# Altium footprint library 金属膜电容.PcbLib: 38 footprints (part 1 of 3)
Each footprint in its own frame and in the unit in brackets; x right, y up, seen from the top. Pads: shape width x height; smd on the part's side, far side on the other; paste and mask are expansions set on the pad; w line width, h text height; cw(c..) or ccw(c..) is an arc to the next point about the centre after c.
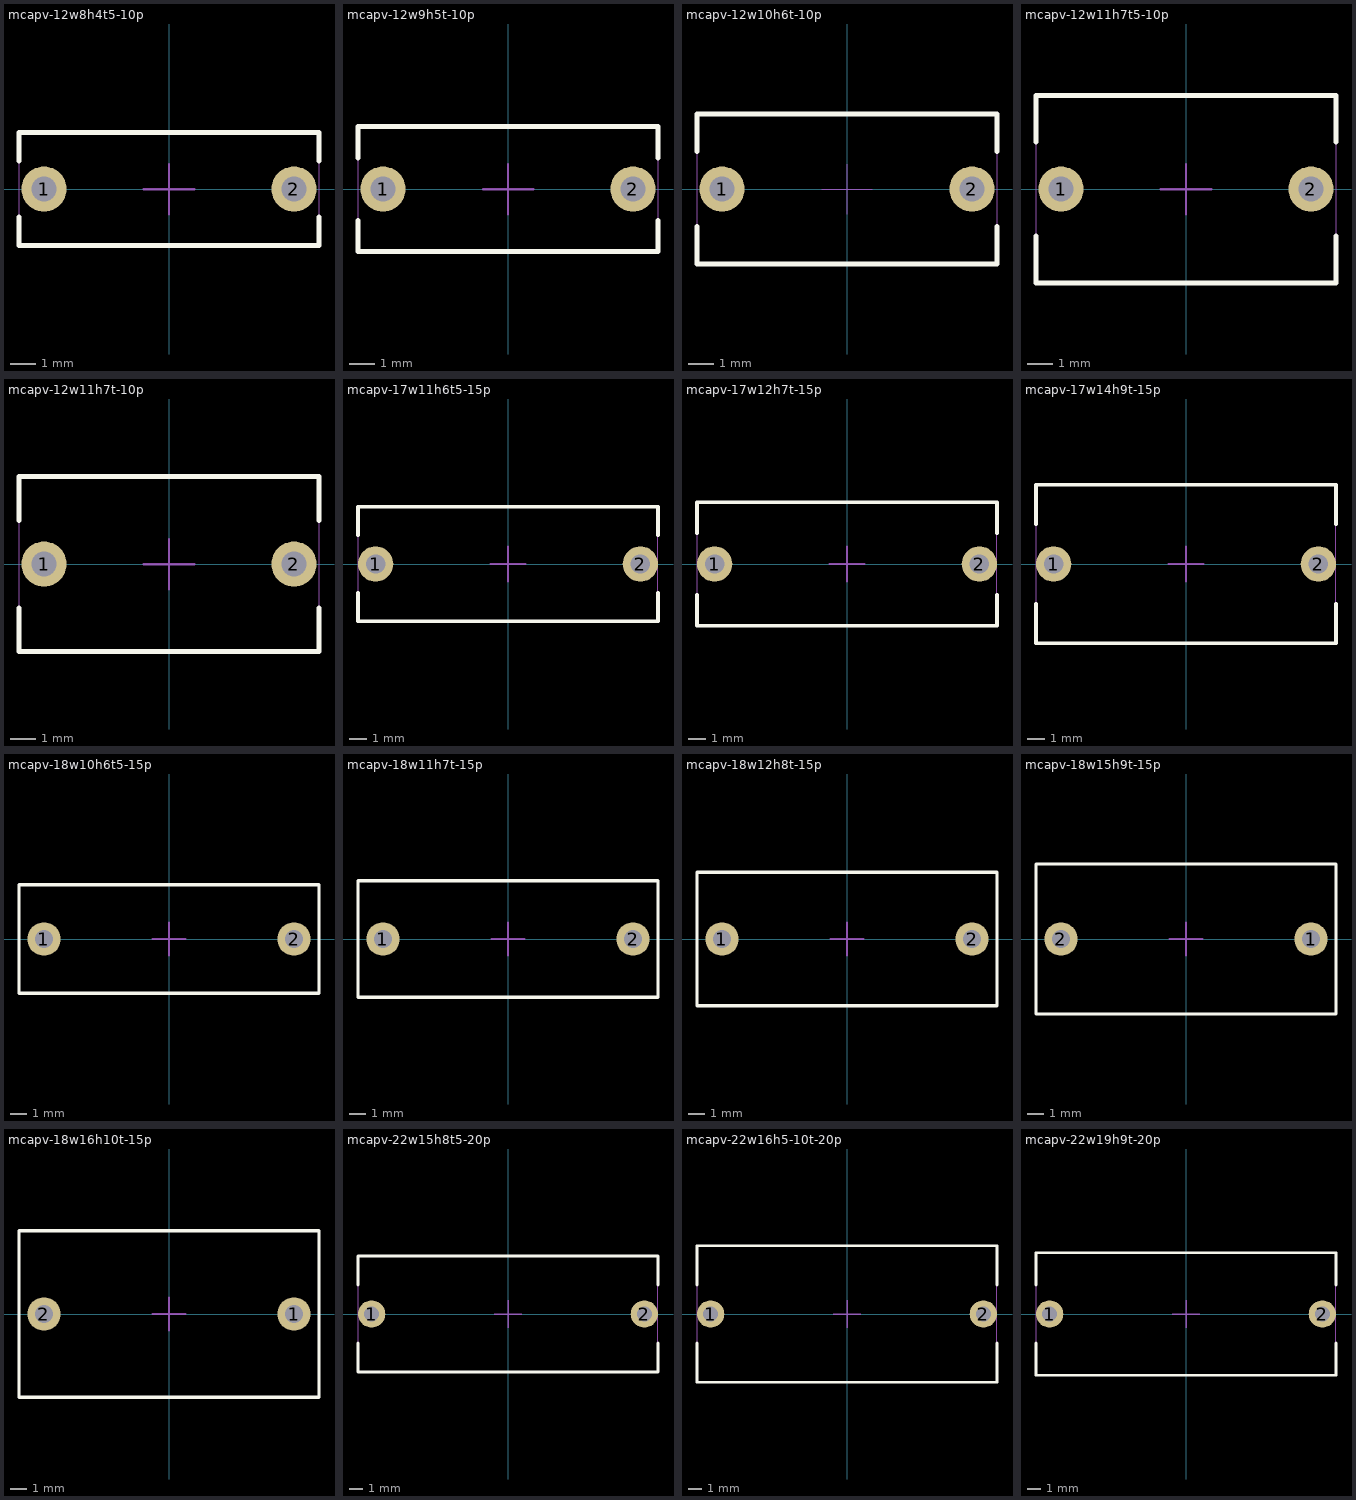
[diagram p0: the footprints below, top view; thin cyan lines are the x and y axes]

## mcapv-12w8h4t5-10p [mm] "金属膜电容"
height 9
pads (2):
  round 1.8 hole 1: 1(-5,0) 2(5,0)
Top Overlay:
  lines w0.2: -6,-1.125 -6,-2.25 6,-2.25 6,-1.125 ; -6,1.126 -6,2.251 6,2.251 6,1.126
Mechanical 13:
  lines w0.05: -6,-2.25 6,-2.25 6,2.251 -6,2.251 -6,-2.25
Mechanical 15:
  lines w0.1: -1,0 1,0 ; 0,-1 0,1
3D body: height 9, standoff -4, extent -6,-2.25 6,2.251

## mcapv-12w9h5t-10p [mm] "金属膜电容"
height 10
pads (2):
  round 1.8 hole 1: 1(-5,0) 2(5,0)
Top Overlay:
  lines w0.2: -6,-1.25 -6,-2.5 6,-2.5 6,-1.25 ; -6,1.25 -6,2.5 6,2.5 6,1.25
Mechanical 13:
  lines w0.05: -6,-2.5 6,-2.5 6,2.501 -6,2.501 -6,-2.5
Mechanical 15:
  lines w0.1: -0.991,0 1,0 ; 0,-1 0,1
3D body: height 10.5, standoff -3.5, extent -6,-2.5 6,2.501

## mcapv-12w10h6t-10p [mm] "金属化薄膜电容"
height 11
pads (2):
  round 1.8 hole 1: 1(-5,0) 2(5,0)
Top Overlay:
  lines w0.2: -6,-1.5 -6,-3 6,-3 6,-1.5 ; -6,1.5 -6,3 6,3 6,1.5
Mechanical 13:
  lines w0.05: -6,-3 6,-3 6,3.001 -6,3.001 -6,-3
Mechanical 15:
  lines w0.05: -1,0 1,0 ; 0,-1 0,1
3D body: height 11, standoff -4, extent -6,-3 6,3.001

## mcapv-12w11h7t5-10p [mm] "金属化薄膜电容"
height 12
pads (2):
  round 1.8 hole 1: 1(-5,0) 2(5,0)
Top Overlay:
  lines w0.2: -6,-1.875 -6,-3.75 6,-3.75 6,-1.875 ; -6,1.875 -6,3.75 6,3.75 6,1.875
Mechanical 13:
  lines w0.05: -6,-3.75 6,-3.75 6,3.751 -6,3.751 -6,-3.75
Mechanical 15:
  lines w0.1: -1,0 1,0 ; 0,-1 0,1
3D body: height 12, standoff -4, extent -6,-3.75 6,3.751

## mcapv-12w11h7t-10p [mm] "金属化薄膜电容"
height 12
pads (2):
  round 1.8 hole 1: 1(-5,0) 2(5,0)
Top Overlay:
  lines w0.2: -6,-1.75 -6,-3.5 6,-3.5 6,-1.75 ; -6,1.75 -6,3.5 6,3.5 6,1.75
Mechanical 13:
  lines w0.05: -6,-3.5 6,-3.5 6,3.501 -6,3.501 -6,-3.5
Mechanical 15:
  lines w0.1: -1,0 1,0 ; 0,-1 0,1
3D body: height 12, standoff -4, extent -6,-3.5 6,3.501

## mcapv-17w11h6t5-15p [mm] "金属化薄膜电容"
height 7
pads (2):
  round 2 hole 1.1: 1(-7.5,0) 2(7.5,0)
Top Overlay:
  lines w0.2: -8.5,-1.625 -8.5,-3.25 8.5,-3.25 8.5,-1.625 ; -8.5,1.625 -8.5,3.25 8.5,3.25 8.5,1.625
Mechanical 13:
  lines w0.05: -8.5,-3.25 -8.5,3.251 8.5,3.251 8.5,-3.25 -8.5,-3.25
Mechanical 15:
  lines w0.1: -0.991,0 1,0 ; 0,-1 0,1
3D body: height 12.5, standoff -3.5, extent -8.5,-3.25 8.5,3.251

## mcapv-17w12h7t-15p [mm] "金属化薄膜电容"
height 7
pads (2):
  round 2 hole 1.1: 1(-7.5,0) 2(7.5,0)
Top Overlay:
  lines w0.2: -8.5,-1.75 -8.5,-3.5 8.5,-3.5 8.5,-1.75 ; -8.5,1.75 -8.5,3.5 8.5,3.5 8.5,1.75
Mechanical 13:
  lines w0.05: -8.5,-3.5 -8.5,3.501 8.5,3.501 8.5,-3.5 -8.5,-3.5
Mechanical 15:
  lines w0.1: -1,0 1,0 ; 0,-1 0,1
3D body: height 12, standoff -5, extent -8.5,-3.5 8.5,3.501

## mcapv-17w14h9t-15p [mm] "金属化薄膜电容"
height 8
pads (2):
  round 2 hole 1.1: 1(-7.5,0) 2(7.5,0)
Top Overlay:
  lines w0.2: -8.5,-2.25 -8.5,-4.5 8.5,-4.5 8.5,-2.25 ; -8.5,2.25 -8.5,4.5 8.5,4.5 8.5,2.25
Mechanical 13:
  lines w0.05: -8.5,-4.5 8.5,-4.5 8.5,4.501 -8.5,4.501 -8.5,-4.5
Mechanical 15:
  lines w0.1: -1,0 1,0 ; 0,-1 0,1
3D body: height 15, standoff -4, extent -8.5,-4.5 8.5,4.501

## mcapv-18w10h6t5-15p [mm] "金属化薄膜电容"
height 6
pads (2):
  round 2 hole 1.1: 1(-7.5,0) 2(7.5,0)
Top Overlay:
  lines w0.2: -9,-3.25 9,-3.25 9,3.25 -9,3.25 -9,-3.25
Mechanical 13:
  lines w0.05: -9,-3.25 -9,3.251 9,3.251 9,-3.25 -9,-3.25
Mechanical 15:
  lines w0.1: -1,0 1,0 ; 0,-1 0,1
3D body: height 11, standoff -4, extent -9,-3.25 9,3.251

## mcapv-18w11h7t-15p [mm] "金属化薄膜电容"
height 7
pads (2):
  round 2 hole 1.1: 1(-7.5,0) 2(7.5,0)
Top Overlay:
  lines w0.2: -9,-3.5 -9,3.5 9,3.5 9,-3.5 -9,-3.5
Mechanical 13:
  lines w0.05: -9,-3.5 9,-3.5 9,3.501 -9,3.501 -9,-3.5
Mechanical 15:
  lines w0.1: -1,0 1,0 ; 0,-1 0,1
3D body: height 12, standoff -4, extent -9,-3.5 9,3.501

## mcapv-18w12h8t-15p [mm] "金属化薄膜电容"
height 7
pads (2):
  round 2 hole 1.1: 1(-7.5,0) 2(7.5,0)
Top Overlay:
  lines w0.2: -9,-4 9,-4 9,4 -9,4 -9,-4
Mechanical 13:
  lines w0.05: -9,-4 9,-4 9,4.001 -9,4.001 -9,-4
Mechanical 15:
  lines w0.1: -1,0 1,0 ; 0,-1 0,1
3D body: height 13, standoff -4, extent -9,-4 9,4.001

## mcapv-18w15h9t-15p [mm] "金属化薄膜电容"
height 8
pads (2):
  round 2 hole 1.1: 1(7.5,0) 2(-7.5,0)
Top Overlay:
  lines w0.2: -9,-4.5 9,-4.5 9,4.5 -9,4.5 -9,-4.5
Mechanical 13:
  lines w0.05: -9,-4.5 9,-4.5 9,4.506 -9,4.506 -9,-4.5
Mechanical 15:
  lines w0.1: -1,0 1,0 ; 0,-1 0,1
3D body: height 16, standoff -4, extent -9,-4.5 9,4.506

## mcapv-18w16h10t-15p [mm] "金属化薄膜电容"
height 9
pads (2):
  round 2 hole 1.1: 1(7.5,0) 2(-7.5,0)
Top Overlay:
  lines w0.2: -1,-5 -9,-5 ; -9,-5 9,-5 9,5 -9,5 -9,-5
Mechanical 13:
  lines w0.05: -9,-5 -9,5 9,5 9,-5 -9,-5
Mechanical 15:
  lines w0.1: -1,0 1,0 ; 0,-1 0,1
3D body: height 17, standoff -4, extent -9,-5 9,5.001

## mcapv-22w15h8t5-20p [mm] "金属化薄膜电容"
height 9
pads (2):
  round 2 hole 1.1: 1(-10,0) 2(10,0)
Top Overlay:
  lines w0.2: -11,-2.125 -11,-4.25 11,-4.25 11,-2.125 ; -11,2.125 -11,4.25 11,4.25 11,2.125
Mechanical 13:
  lines w0.05: -11,-4.25 11,-4.25 11,4.251 -11,4.251 -11,-4.25
Mechanical 15:
  lines w0.1: -1,0 1,0 ; 0,-1 0,1
3D body: height 16, standoff -4, extent -11,-4.25 11,4.251

## mcapv-22w16h5-10t-20p [mm] "金属化薄膜电容"
height 9
pads (2):
  round 2 hole 1.1: 1(-10,0) 2(10,0)
Top Overlay:
  lines w0.2: -11,-2.125 -11,-5 11,-5 11,-2.125 ; -11,2.125 -11,5.001 11,5.001 11,2.125
Mechanical 13:
  lines w0.05: -11,-5 -11,5.001 11,5.001 11,-5 -11,-5
Mechanical 15:
  lines w0.1: -1,0 1,0 ; 0,-1 0,1
3D body: height 17.25, standoff -4.25, extent -11,-5 11,5.001

## mcapv-22w19h9t-20p [mm] "金属化薄膜电容"
height 10.5
pads (2):
  round 2 hole 1.1: 1(-10,0) 2(10,0)
Top Overlay:
  lines w0.2: -11,-2.125 -11,-4.5 11,-4.5 11,-2.125 ; -11,2.125 -11,4.501 11,4.501 11,2.125
Mechanical 13:
  lines w0.05: -11,-4.5 11,-4.5 11,4.501 -11,4.501 -11,-4.5
Mechanical 15:
  lines w0.1: -1,0 1,0 ; 0,-1 0,1
3D body: height 20, standoff -4, extent -11,-4.5 11,4.501